# Altium footprint library LOGTURTLE_APR_25_TX.PcbLib: 88 footprints (part 5 of 6)
Each footprint in its own frame and in the unit in brackets; x right, y up, seen from the top. Pads: shape width x height; smd on the part's side, far side on the other; paste and mask are expansions set on the pad; w line width, h text height; cw(c..) or ccw(c..) is an arc to the next point about the centre after c.
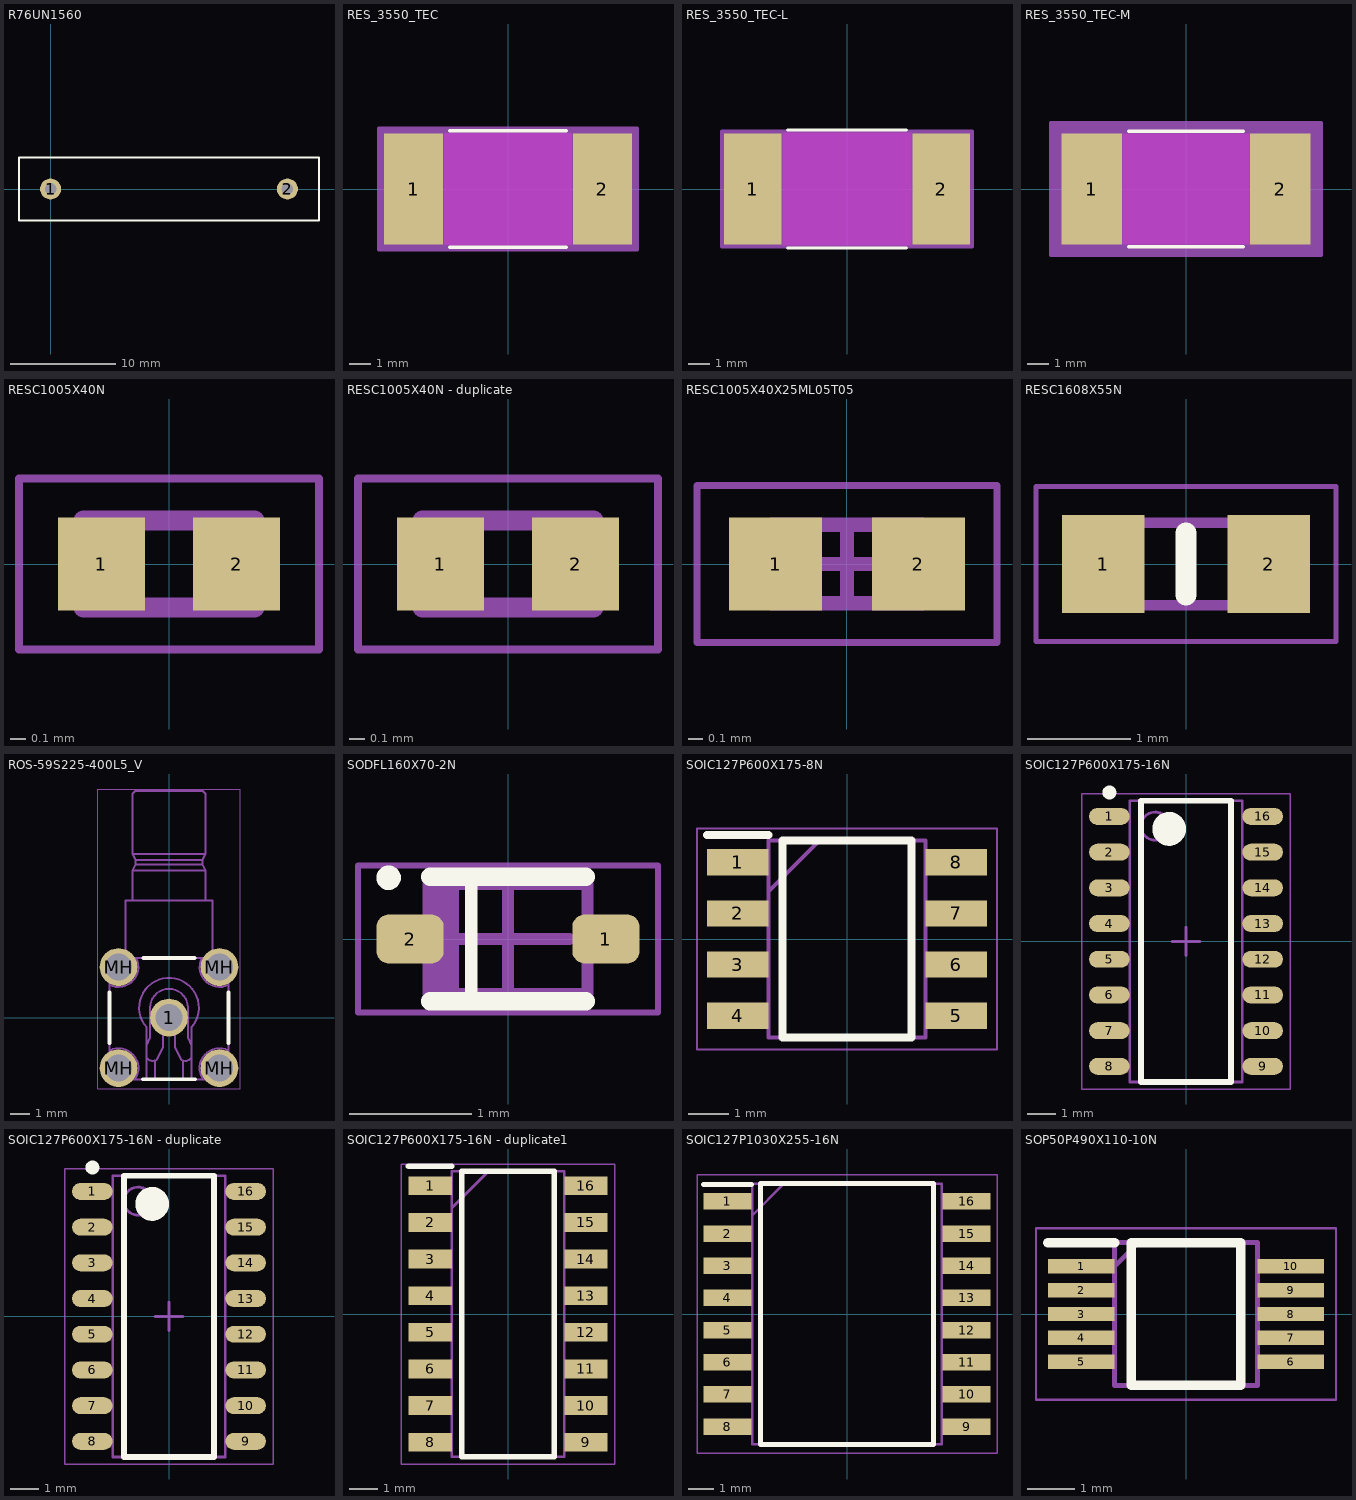
[diagram p4: the footprints below, top view; thin cyan lines are the x and y axes]

## R76UN1560 [mm]
pads (2):
  round 2 hole 1.1: 1(0,0) 2(22.5,0)
Top Overlay:
  lines w0.2: -3,-3 -3,3 0,3 22.5,3 25.5,3 25.5,-3 22.5,-3 0,-3 -3,-3

## RES_3550_TEC [mil]
pads (2):
  rect 110x207 smd paste+0 mask+0: 1(-175.5,0) 2(175.5,0)
Top Layer keep-out:
  region: -118.5,-101.5 -118.5,101.5 118.5,101.5 118.5,-101.5
Top Overlay:
  lines w6: -108.39,-108.5 108.39,-108.5 ; -108.39,108.5 108.39,108.5
  text ".Designator" at -137.5,-25 h50
Keep-Out Layer:
  region: -118.5,-103.5 -118.5,103.5 118.5,103.5 118.5,-103.5
Mechanical 13:
  lines w1: -222.5,-103.5 -222.5,103.5 ; -222.5,-103.5 222.5,-103.5 ; -222.5,-103.5 -120.5,-103.5 -120.5,103.5 -222.5,103.5 ; -222.5,-103.5 -222.5,103.5 ; -222.5,103.5 222.5,103.5 ; 222.5,-103.5 222.5,103.5 ; 222.5,-103.5 222.5,103.5 ; 222.5,-103.5 120.5,-103.5 120.5,103.5 222.5,103.5
  text ".Designator" at -137.5,-25 h50
Mechanical 15:
  region: 240.5,-113.5 -240.5,-113.5 -240.5,113.5 240.5,113.5
  lines w6: -240.5,-113.5 240.5,-113.5 240.5,113.5 -240.5,113.5 -240.5,-113.5
3D body "RES_3550_TEC.step": height 47.01, standoff 0, extent -222.48,-103.5 222.48,103.5

## RES_3550_TEC-L [mil]
pads (2):
  rect 106x205 smd paste+0 mask+0: 1(-173.5,0) 2(173.5,0)
Top Layer keep-out:
  region: -118.5,-101.5 -118.5,101.5 118.5,101.5 118.5,-101.5
Top Overlay:
  lines w6: -108.85,-108.5 108.85,-108.5 ; -108.85,108.5 108.85,108.5
  text ".Designator" at -137.5,-25 h50
Keep-Out Layer:
  region: -118.5,-103.5 -118.5,103.5 118.5,103.5 118.5,-103.5
Mechanical 13:
  lines w1: -222.5,-103.5 -222.5,103.5 ; -222.5,-103.5 -120.5,-103.5 -120.5,103.5 -222.5,103.5 ; -222.5,-103.5 222.5,-103.5 ; -222.5,-103.5 -222.5,103.5 ; -222.5,103.5 222.5,103.5 ; 222.5,-103.5 120.5,-103.5 120.5,103.5 222.5,103.5 ; 222.5,-103.5 222.5,103.5 ; 222.5,-103.5 222.5,103.5
  text ".Designator" at -137.5,-25 h50
Mechanical 15:
  region: 230.5,-106.5 -230.5,-106.5 -230.5,106.5 230.5,106.5
  lines w6: -230.5,-106.5 -230.5,106.5 230.5,106.5 230.5,-106.5 -230.5,-106.5
3D body "RES_3550_TEC.step": height 47.01, standoff 0, extent -222.48,-103.5 222.48,103.5

## RES_3550_TEC-M [mil]
pads (2):
  rect 114x209 smd paste+0 mask+0: 1(-177.5,0) 2(177.5,0)
Top Layer keep-out:
  region: -118.5,-101.5 -118.5,101.5 118.5,101.5 118.5,-101.5
Top Overlay:
  lines w6: -108.03,-108.5 108.03,-108.5 ; -108.03,108.5 108.03,108.5
  text ".Designator" at -137.5,-25 h50
Keep-Out Layer:
  region: -118.5,-103.5 -118.5,103.5 118.5,103.5 118.5,-103.5
Mechanical 13:
  lines w1: -222.5,-103.5 -222.5,103.5 ; -222.5,-103.5 222.5,-103.5 ; -222.5,-103.5 -120.5,-103.5 -120.5,103.5 -222.5,103.5 ; -222.5,-103.5 -222.5,103.5 ; -222.5,103.5 222.5,103.5 ; 222.5,-103.5 222.5,103.5 ; 222.5,-103.5 222.5,103.5 ; 222.5,-103.5 120.5,-103.5 120.5,103.5 222.5,103.5
  text ".Designator" at -137.5,-25 h50
Mechanical 15:
  region: 254.5,-124.5 -254.5,-124.5 -254.5,124.5 254.5,124.5
  lines w6: -254.5,-124.5 254.5,-124.5 254.5,124.5 -254.5,124.5 -254.5,-124.5
3D body "RES_3550_TEC.step": height 47.01, standoff 0, extent -222.48,-103.5 222.48,103.5

## RESC1005X40N [mm]
pads (2):
  rect 0.56x0.6 smd: 1(-0.435,0) 2(0.435,0)
Mechanical 13:
  lines w0.127: -0.55,-0.28 0.55,-0.28 0.55,0.28 -0.55,0.28 -0.55,-0.28
Mechanical 15:
  lines w0.05: -0.965,-0.55 0.965,-0.55 0.965,0.55 -0.965,0.55 -0.965,-0.55
3D body "step_temp.STEP": height 0.4, standoff 0, extent -0.5,-0.25 0.5,0.25

## RESC1005X40N - duplicate [mm]
pads (2):
  rect 0.56x0.6 smd: 1(-0.435,0) 2(0.435,0)
Mechanical 13:
  lines w0.127: -0.55,-0.28 -0.55,0.28 0.55,0.28 0.55,-0.28 -0.55,-0.28
Mechanical 15:
  lines w0.05: -0.965,-0.55 -0.965,0.55 0.965,0.55 0.965,-0.55 -0.965,-0.55
3D body "step_temp.STEP": height 0.4, standoff 0, extent -0.5,-0.25 0.5,0.25

## RESC1005X40X25ML05T05 [mm] "Chip Resistor, 2-Leads, Body 1.00x0.50mm, IPC Low Density"
height 0.4
pads (2):
  rect 0.65x0.65 smd: 1(-0.5,0) 2(0.5,0)
Mechanical 13:
  lines w0.1: -0.525,-0.275 0.525,-0.275 0.525,0.275 -0.525,0.275 -0.525,-0.275
Mechanical 15:
  lines w0.05: -1.05,-0.55 1.05,-0.55 1.05,0.55 -1.05,0.55 -1.05,-0.55
  lines w0.1: -0.275,0 0.275,0 ; 0,-0.275 0,0.275
3D body: height 0.4, standoff 0, extent 0.275,-0.275 0.525,0.275
3D body: height 0.4, standoff 0, extent -0.525,-0.275 -0.275,0.275
3D body: height 0.4, standoff 0, extent -0.275,-0.275 0.275,0.275

## RESC1608X55N [mm]
pads (2):
  rect 0.8x0.95 smd: 1(-0.8,0) 2(0.8,0)
Top Overlay:
  lines w0.2: 0,-0.3 0,0.3
Mechanical 13:
  lines w0.1: -0.8,-0.4 0.8,-0.4 0.8,0.4 -0.8,0.4 -0.8,-0.4
Mechanical 15:
  lines w0.05: -1.45,-0.75 1.45,-0.75 1.45,0.75 -1.45,0.75 -1.45,-0.75
3D body "RC0603JR-070RL.stp": height 0.46, standoff 0, extent -0.8,-0.4 0.8,0.4

## ROS-59S225-400L5_V [mm] "SMB Right Angle Plug, 14.5x6x8.3mm, Rosenberger Recommended"
height 8.3
pads (5):
  round 1.9 hole 1.35: 1(0,0) MH(-2.54,-2.54) MH(-2.54,2.54) MH(2.54,-2.54) MH(2.54,2.54)
Top Overlay:
  lines w0.2: -3,-1.271 -3,1.271 ; -1.312,-3.1 1.312,-3.1 ; -1.271,3 1.271,3 ; 3,-1.271 3,1.271
Mechanical 13:
  circle w0.1: c0,0 r0.46
  lines w0.1: -2.999,-2.343 cw(c-2.54,-2.54) -2.998,-2.74 ; -3,-1.652 cw(c-2.54,-2.54) -1.712,-3.1 ; -3,1.652 ccw(c-2.54,2.54) -1.653,3 ; -2.999,2.342 ccw(c-2.54,2.54) -2.345,3 ; -3,2.736 cw(c-2.54,2.54) -2.735,3 ; -2.2,3 -2.2,5.9 -1.84,5.9 ; -1.125,-3.1 -1.125,-0.494 ; -1.125,-2 ccw(c-0.817,-1.817) -0.633,-2.125 -0.3,-1.494 -0.3,-0.349 ; -1.125,-1.4 -0.95,-1 -0.95,0.5 cw(c0,0.5) 0.95,0.5 0.95,-1 1.125,-1.4 ; -1.122,-0.494 cw(c0,0.5) 1.128,-0.487 ; -0.7,-3.05 -0.7,-2.16 ; -0.3,0.347 -0.3,0.5 cw(c0,0.5) 0.3,0.5 0.3,0.347 ; 0.3,-0.349 0.3,-1.494 0.633,-2.125 ccw(c0.817,-1.817) 1.125,-2 ; 0.7,-3.05 0.7,-2.16 ; 1.125,-3.1 1.125,-0.484 ; 1.652,3 ccw(c2.54,2.54) 3,1.652 ; 1.712,-3.1 cw(c2.54,-2.54) 3,-1.652 ; 2.2,3 2.2,5.9 1.84,5.9 ; 2.345,3 ccw(c2.54,2.54) 2.999,2.342 ; 2.735,3 cw(c2.54,2.54) 3,2.736 ; 2.998,-2.74 cw(c2.54,-2.54) 2.999,-2.343 ; -1.84,5.9 -1.84,7.393 ; -1.84,5.9 1.84,5.9 ; -1.84,7.393 -1.69,7.701 ; -1.84,7.393 1.84,7.393 ; -1.839,8.229 -1.84,11.25 -1.69,11.4 1.69,11.4 1.84,11.25 1.838,8.229 ; -1.839,8.229 -1.69,7.938 ; -1.839,8.229 1.838,8.229 ; -1.69,7.701 -1.69,7.938 ; -1.69,7.701 1.69,7.701 ; -1.69,7.938 1.69,7.938 ; 1.69,7.701 1.84,7.393 ; 1.69,7.701 1.69,7.938 ; 1.69,7.938 1.838,8.229 ; 1.84,5.9 1.84,7.393 ; -3,-3.1 3,-3.1 3,3 -3,3 -3,-3.1
Mechanical 15:
  lines w0.05: -3.59,-3.59 -3.59,11.5 3.59,11.5 3.59,-3.59 -3.59,-3.59
  lines w0.1: -0.5,0 0.5,0 ; 0,-0.5 0,0.5
3D body "59s225-400_sw0002.stp": height 8.3, standoff -3.1, extent -3,-3.1 3,11.4

## SODFL160X70-2N [mm] "SODFL, 2-Leads, Body 0.80x1.60mm, IPC Medium Density"
height 0.7
pads (2):
  rrect50% 0.55x0.4 smd: 1(0.8,0) 2(-0.8,0)
Top Overlay:
  circle w0.1: c-0.975,0.5 r0.05
  lines w0.1: -0.3,-0.525 -0.3,0.5
  lines w0.15: -0.635,-0.508 0.635,-0.508 ; -0.635,0.508 0.635,0.508
Mechanical 13:
  rectangle: -0.65,-0.5 -0.4,0.45
  lines w0.1: -0.65,-0.45 -0.65,0.45 0.65,0.45 0.65,-0.45 -0.65,-0.45
  text ".Designator" at -1,-0.351 h1
Mechanical 15:
  lines w0.05: -1.225,-0.6 -1.225,0.6 1.225,0.6 1.225,-0.6 -1.225,-0.6
  lines w0.1: -0.5,0 0.5,0 ; 0,-0.5 0,0.5
3D body "SODFL160X70-2N.step": height 0.7, standoff 0, extent -0.8,-0.45 0.8,0.45

## SOIC127P600X175-8N [mm]
pads (8):
  rect 1.525x0.65 smd: 1(-2.712,1.905) 2(-2.712,0.635) 3(-2.712,-0.635) 4(-2.712,-1.905) 5(2.712,-1.905) 6(2.712,-0.635) 7(2.712,0.635) 8(2.712,1.905)
Top Overlay:
  lines w0.2: -3.475,2.58 -1.95,2.58 ; -1.6,-2.45 1.6,-2.45 1.6,2.45 -1.6,2.45 -1.6,-2.45
Mechanical 13:
  lines w0.1: -1.95,1.18 -0.68,2.45 ; -1.95,-2.45 1.95,-2.45 1.95,2.45 -1.95,2.45 -1.95,-2.45
Mechanical 15:
  lines w0.05: -3.725,-2.75 3.725,-2.75 3.725,2.75 -3.725,2.75 -3.725,-2.75
3D body "NE555DR.stp": height 1.75, standoff 0, extent -3,-2.45 3,2.45

## SOIC127P600X175-16N [mm] "SOIC, 16-Leads, Body 9.90x3.90mm, Pitch 1.27mm, IPC Medium Density"
height 1.75
pads (16):
  oval 1.45x0.6 smd: 1(-2.725,4.445) 2(-2.725,3.175) 3(-2.725,1.905) 4(-2.725,0.635) 5(-2.725,-0.635) 6(-2.725,-1.905) 7(-2.725,-3.175) 8(-2.725,-4.445) 9(2.725,-4.445) 10(2.725,-3.175) 11(2.725,-1.905) 12(2.725,-0.635) 13(2.725,0.635) 14(2.725,1.905) 15(2.725,3.175) 16(2.725,4.445)
Top Overlay:
  circle w0.25: c-2.725,5.295 r0.125
  circle w0.6: c-0.6,4 r0.3
  lines w0.2: -1.6,-5 -1.6,5 1.6,5 1.6,-5 -1.6,-5
Mechanical 13:
  circle w0.1: c-1.1,4.1 r0.5
  lines w0.1: -2,-5 -2,5 2,5 2,-5 -2,-5
  text ".Designator" at 0.402,-3.45 h2
Mechanical 15:
  lines w0.05: -3.7,-5.25 -3.7,5.25 3.7,5.25 3.7,-5.25 -3.7,-5.25
  lines w0.1: -0.5,0 0.5,0 ; 0,-0.5 0,0.5
3D body "SOIC127P600X175-16N.step": height 1.75, standoff 0, extent -3,-5 3,5

## SOIC127P600X175-16N - duplicate [mm] "SOIC, 16-Leads, Body 9.90x3.90mm, Pitch 1.27mm, IPC Medium Density"
height 1.75
pads (16):
  oval 1.45x0.6 smd: 1(-2.725,4.445) 2(-2.725,3.175) 3(-2.725,1.905) 4(-2.725,0.635) 5(-2.725,-0.635) 6(-2.725,-1.905) 7(-2.725,-3.175) 8(-2.725,-4.445) 9(2.725,-4.445) 10(2.725,-3.175) 11(2.725,-1.905) 12(2.725,-0.635) 13(2.725,0.635) 14(2.725,1.905) 15(2.725,3.175) 16(2.725,4.445)
Top Overlay:
  circle w0.25: c-2.725,5.295 r0.125
  circle w0.6: c-0.6,4 r0.3
  lines w0.2: -1.6,-5 -1.6,5 1.6,5 1.6,-5 -1.6,-5
Mechanical 13:
  circle w0.1: c-1.1,4.1 r0.5
  lines w0.1: -2,-5 -2,5 2,5 2,-5 -2,-5
Mechanical 15:
  lines w0.05: -3.7,-5.25 -3.7,5.25 3.7,5.25 3.7,-5.25 -3.7,-5.25
  lines w0.1: -0.5,0 0.5,0 ; 0,-0.5 0,0.5
3D body: height 1.75, standoff 0.1, extent -2,-5 2,5

## SOIC127P600X175-16N - duplicate1 [mm]
pads (16):
  rect 1.5x0.65 smd: 1(-2.7,4.445) 2(-2.7,3.175) 3(-2.7,1.905) 4(-2.7,0.635) 5(-2.7,-0.635) 6(-2.7,-1.905) 7(-2.7,-3.175) 8(-2.7,-4.445) 9(2.7,-4.445) 10(2.7,-3.175) 11(2.7,-1.905) 12(2.7,-0.635) 13(2.7,0.635) 14(2.7,1.905) 15(2.7,3.175) 16(2.7,4.445)
Top Overlay:
  lines w0.2: -3.45,5.12 -1.95,5.12 ; -1.6,-4.95 1.6,-4.95 1.6,4.95 -1.6,4.95 -1.6,-4.95
Mechanical 13:
  lines w0.1: -1.95,3.68 -0.68,4.95 ; -1.95,-4.95 1.95,-4.95 1.95,4.95 -1.95,4.95 -1.95,-4.95
Mechanical 15:
  lines w0.05: -3.7,-5.2 3.7,-5.2 3.7,5.2 -3.7,5.2 -3.7,-5.2
3D body "Si8275GBD-IS1.stp": height 1.75, standoff 0, extent -3,-4.95 3,4.95

## SOIC127P1030X255-16N [mm]
pads (16):
  rect 1.9x0.65 smd: 1(-4.725,4.445) 2(-4.725,3.175) 3(-4.725,1.905) 4(-4.725,0.635) 5(-4.725,-0.635) 6(-4.725,-1.905) 7(-4.725,-3.175) 8(-4.725,-4.445) 9(4.725,-4.445) 10(4.725,-3.175) 11(4.725,-1.905) 12(4.725,-0.635) 13(4.725,0.635) 14(4.725,1.905) 15(4.725,3.175) 16(4.725,4.445)
Top Overlay:
  lines w0.2: -5.675,5.12 -3.775,5.12 ; -3.425,-5.15 3.425,-5.15 3.425,5.15 -3.425,5.15 -3.425,-5.15
Mechanical 13:
  lines w0.1: -3.75,3.88 -2.48,5.15 ; -3.75,-5.15 3.75,-5.15 3.75,5.15 -3.75,5.15 -3.75,-5.15
Mechanical 15:
  lines w0.05: -5.925,-5.5 5.925,-5.5 5.925,5.5 -5.925,5.5 -5.925,-5.5
3D body "ISO6441DWR.stp": height 2.55, standoff 0, extent -5.15,-5.15 5.15,5.15

## SOP50P490X110-10N [mm]
pads (10):
  rect 1.4x0.3 smd: 1(-2.2,1) 2(-2.2,0.5) 3(-2.2,0) 4(-2.2,-0.5) 5(-2.2,-1) 6(2.2,-1) 7(2.2,-0.5) 8(2.2,0) 9(2.2,0.5) 10(2.2,1)
Top Overlay:
  lines w0.2: -2.9,1.5 -1.5,1.5 ; -1.15,-1.5 1.15,-1.5 1.15,1.5 -1.15,1.5 -1.15,-1.5
Mechanical 13:
  lines w0.1: -1.5,1 -1,1.5 ; -1.5,-1.5 1.5,-1.5 1.5,1.5 -1.5,1.5 -1.5,-1.5
Mechanical 15:
  lines w0.05: -3.15,-1.8 3.15,-1.8 3.15,1.8 -3.15,1.8 -3.15,-1.8
3D body "TLV1872DGSR.stp": height 1.1, standoff 0, extent -2.463,-1.5 2.463,1.5